# Altium footprint library JL_PCB.PCBLIB: 1112 footprints (part 3 of 71)
Each footprint in its own frame and in the unit in brackets; x right, y up, seen from the top. Pads: shape width x height; smd on the part's side, far side on the other; paste and mask are expansions set on the pad; w line width, h text height; cw(c..) or ccw(c..) is an arc to the next point about the centre after c.
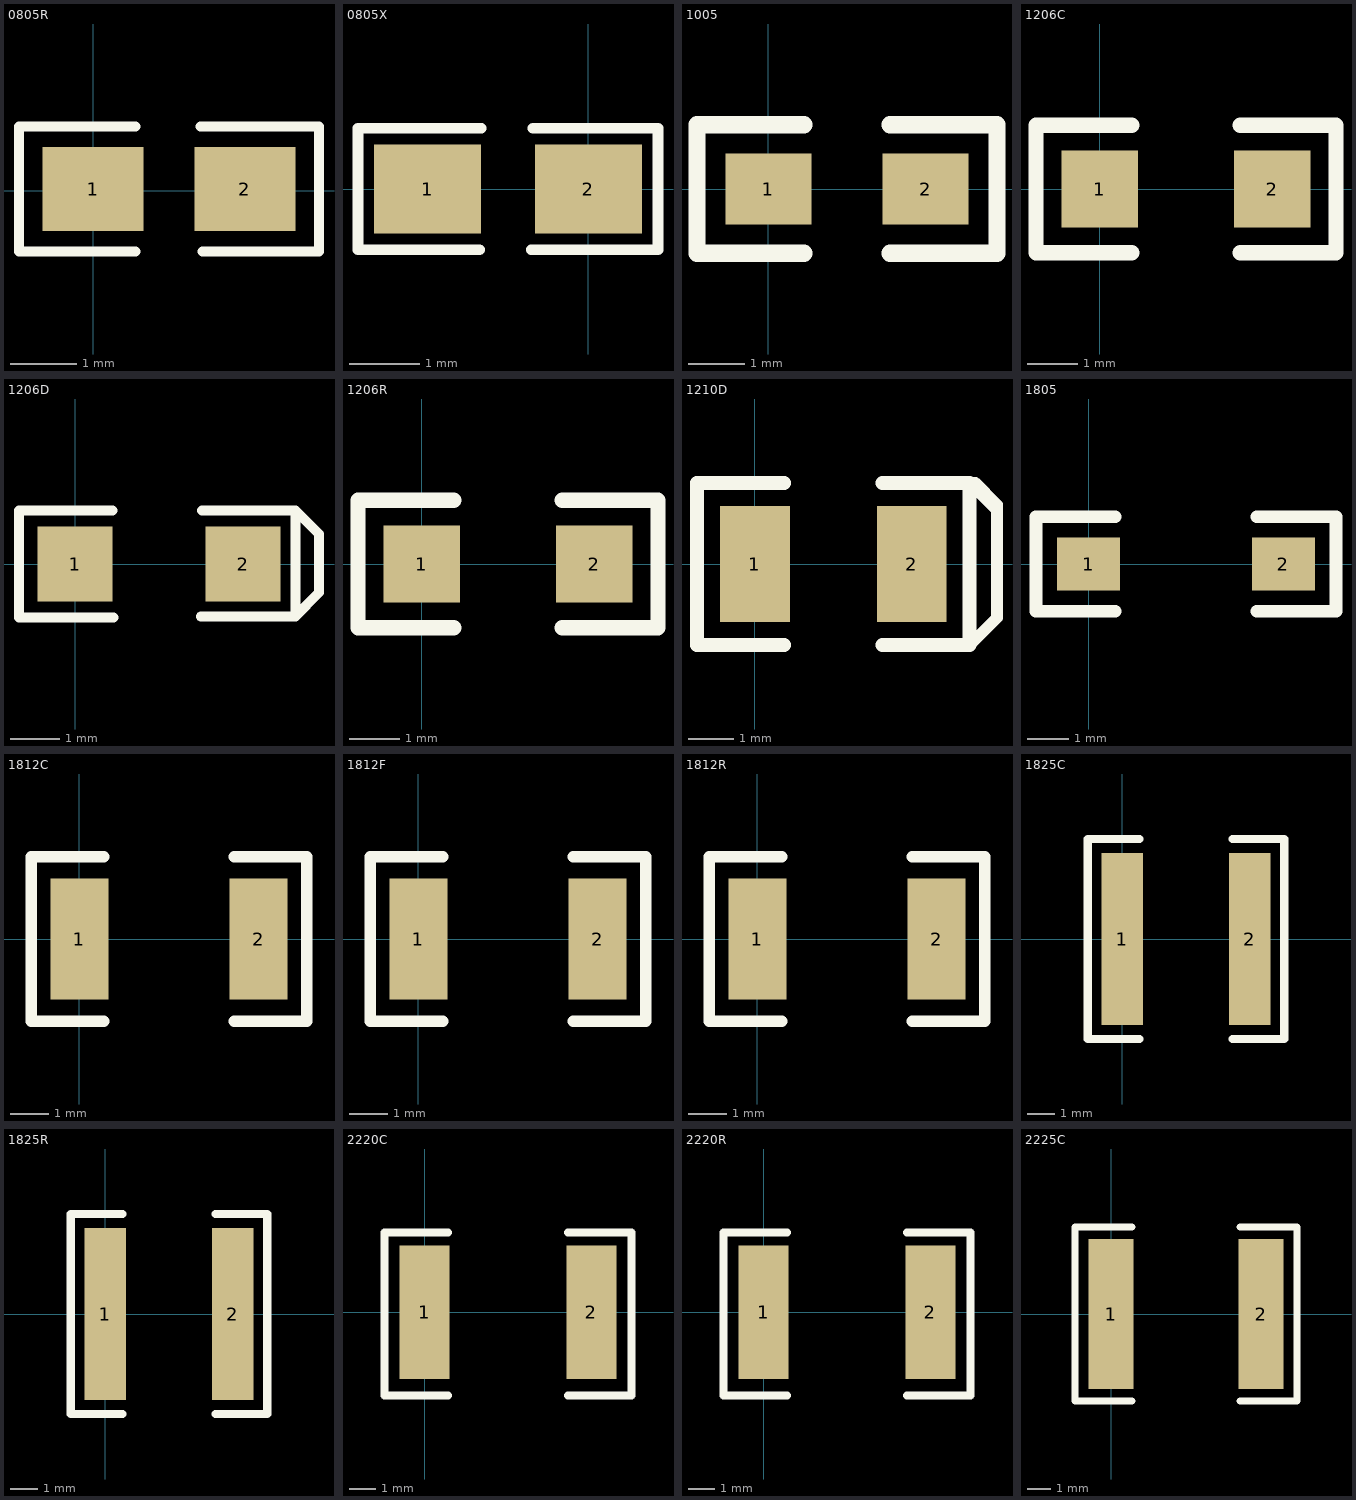
[diagram p2: the footprints below, top view; thin cyan lines are the x and y axes]

## 0805R [mil]
pads (2):
  rect 60x50 smd: 1(0,1) 2(90,1)
TopOverlay:
  lines w6: -44,38 -44,-36 25,-36 ; -43.31,38 25,38 ; 63.78,38 134,38 134,-36 64.96,-36
3D body "R0805.STEP": height 21.65, standoff 0, extent 4.63,-23.8 83.37,25.81

## 0805X [mil]
pads (2):
  rect 60x50 smd: 1(-90,0) 2(0,0)
TopOverlay:
  lines w6: -61,-34 -129,-34 -129,34 -60,34 ; -32,-34 39,-34 39,34 -31,34
3D body "User Library-0805 SMD Capacitor.step": height 31.39, standoff 0.6, extent -86.37,-23.6 -7.63,25.61

## 1005 [mil]
pads (2):
  rect 60x50 smd: 1(0,0) 2(110,0)
TopOverlay:
  lines w12: 25,-45 -50,-45 -50,45 25,45 ; 85,-45 160,-45 160,45 85,45

## 1206C [mil]
pads (2):
  rect 60x60 smd: 1(0,0) 2(135,0)
TopOverlay:
  lines w12: 25,-50 -50,-50 -50,50 25,50 ; 110,-50 185,-50 185,50 110,50
3D body "User Library-1206 SMD Capacitor.step": height 40.05, standoff 0.6, extent 6.01,-33.49 132,29.5

## 1206D [mil]
pads (2):
  rect 60x60 smd: 1(0,0) 2(135,0)
TopOverlay:
  lines w8: -45,-43 -45,43 30,43 ; -44,-43 31,-43 ; 101,-42 176,-42 ; 102,43 177,43 ; 177,43 196,24 196,-23 177,-42 177,43
3D body "User Library-res1206-1.step": height 21.65, standoff 0, extent 5.02,-32.49 131,30.5

## 1206R [mil]
pads (2):
  rect 60x60 smd: 1(0,0) 2(135,0)
TopOverlay:
  lines w12: 25,-50 -50,-50 -50,50 25,50 ; 110,-50 185,-50 185,50 110,50
3D body "User Library-res1206-1.step": height 21.65, standoff 0, extent 5.02,-32.49 131,30.5

## 1210D [mil]
pads (2):
  rect 60x100 smd: 1(0,0) 2(135,0)
TopOverlay:
  lines w10: 208.66,-46.34 185,-70 208.66,-46.34 ; 208.66,-46.34 208.66,19.68 208.66,46.34 185,70 189.84,70 208.66,51.18 208.66,-46.34
  lines w12: 25,-70 -50,-70 -50,70 25,70 ; 110,-70 185,-70 185,70 110,70
3D body "CircuitWorks-LED 1206.STEP": height 41.94, standoff -1.36, extent 4.01,-31.49 129.99,31.5

## 1805 [mil]
pads (2):
  rect 60x50 smd: 1(0,0) 2(185,0)
TopOverlay:
  lines w12: 25,-45 -50,-45 -50,45 25,45 ; 160,-45 235,-45 235,45 160,45

## 1812C [mil]
pads (2):
  rect 60x125 smd: 1(0,0) 2(185,0)
TopOverlay:
  lines w12: 25,-85 -50,-85 -50,85 25,85 ; 160,-85 235,-85 235,85 160,85
3D body "User Library-1812 SMD Capacitor.step": height 63.67, standoff 0.6, extent 4.42,-62.99 181.59,63

## 1812F [mil]
pads (2):
  rect 60x125 smd: 1(0,0) 2(185,0)
TopOverlay:
  lines w12: 25,-85 -50,-85 -50,85 25,85 ; 160,-85 235,-85 235,85 160,85
3D body "User Library-fuse1812.step": height 51.97, standoff 0, extent -0.88,-63 188.88,63.77

## 1812R [mil]
pads (2):
  rect 60x125 smd: 1(0,0) 2(185,0)
TopOverlay:
  lines w12: 25,-85 -50,-85 -50,85 25,85 ; 160,-85 235,-85 235,85 160,85
3D body "User Library-1812 SMD Resistor.step": height 63.67, standoff 0.6, extent 4.42,-62.99 181.59,63

## 1825C [mil]
pads (2):
  rect 60x250 smd: 1(0,0) 2(185,0)
TopOverlay:
  lines w12: 25,-145 -50,-145 -50,145 25,145 ; 160,-145 235,-145 235,145 160,145
3D body "User Library-CAPC4564X13.step": height 51.18, standoff 0, extent 5.42,-126.98 182.59,124.99

## 1825R [mil]
pads (2):
  rect 60x250 smd: 1(0,0) 2(185,0)
TopOverlay:
  lines w12: 25,-145 -50,-145 -50,145 25,145 ; 160,-145 235,-145 235,145 160,145
3D body "User Library-1825(4564M) Res.step": height 100.7, standoff 0.6, extent -18.62,-128 202.63,124

## 2220C [mil]
pads (2):
  rect 75x200 smd: 1(0,0) 2(250,0)
TopOverlay:
  lines w12: 35,-125 -60,-125 -60,120 35,120 ; 215,-125 310,-125 310,120 215,120
3D body "User Library-CAPC5750X26.step": height 102.36, standoff 0, extent 12.8,-100.42 237.21,96.44

## 2220R [mil]
pads (2):
  rect 75x200 smd: 1(0,0) 2(250,0)
TopOverlay:
  lines w12: 35,-125 -60,-125 -60,120 35,120 ; 215,-125 310,-125 310,120 215,120
3D body "User Library-V2220HD.STEP": height 98.43, standoff 0, extent 13.8,-99.42 238.21,97.43

## 2225C [mil]
pads (2):
  rect 75x250 smd: 1(0,0) 2(250,0)
TopOverlay:
  lines w12: 35,-145 -60,-145 -60,145 35,145 ; 215,-145 310,-145 310,145 215,145
3D body "2225C.STEP": height 59.06, standoff 0, extent 13.8,-125.99 238.21,124